# Altium schematic symbol library MCU_ST_STM32F4.SchLib: 300 symbols (part 7 of 10) (continued)
## STM32F446Z_C-E_Tx (continued)
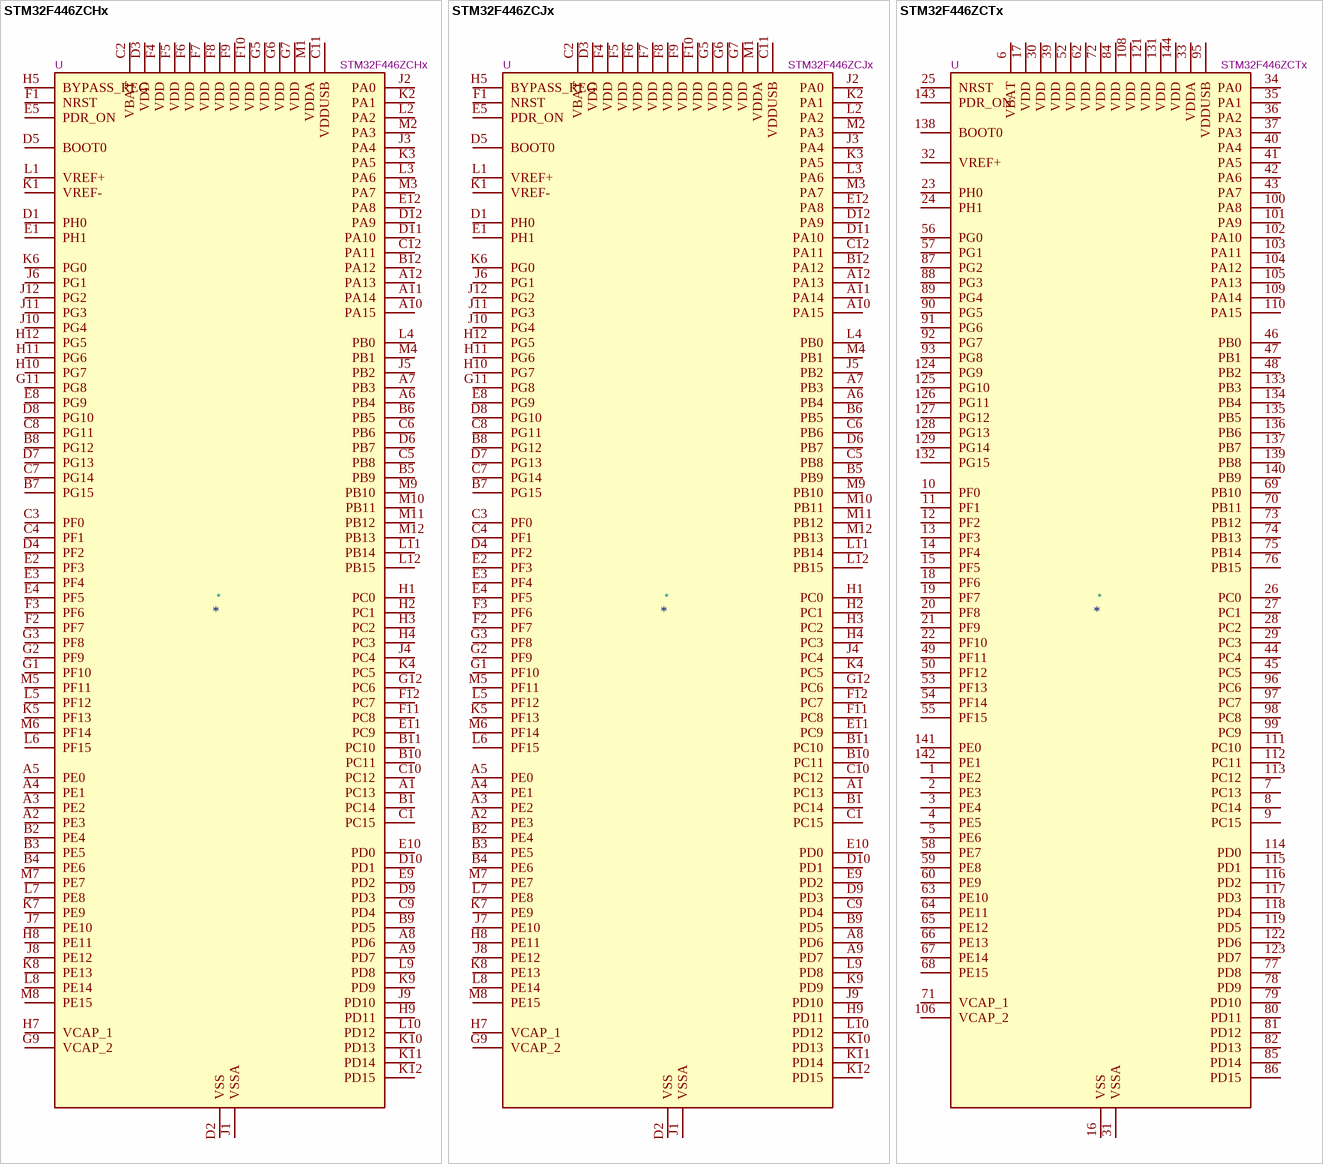
[diagram p56: symbols STM32F446ZCHx to STM32F446ZCTx]

## STM32F446ZCHx
designator *  value STM32F446ZCHx  Reference: U
ki_keywords: Arm Cortex-M4 STM32F4 STM32F446; ki_description: STMicroelectronics Arm Cortex-M4 MCU, 256KB flash, 128KB RAM, 180 MHz, 1.8-3.6V, 114 GPIO, UFBGA144; ki_fp_filters: *UFBGA*7x7mm*Layout12x12*P0.5mm*; Footprint: Package_BGA:UFBGA-144_7x7mm_Layout12x12_P0.5mm; Datasheet: https://www.st.com/resource/en/datasheet/stm32f446zc.pdf
pins: A1 PC13, A2 PE3, A3 PE2, A4 PE1, A5 PE0, A6 PB4, A7 PB3, A8 PD6, A9 PD7, A10 PA15, A11 PA14, A12 PA13, B1 PC14, B2 PE4, B3 PE5, B4 PE6, B5 PB9, B6 PB5, B7 PG15, B8 PG12, B9 PD5, B10 PC11, B11 PC10, B12 PA12, C1 PC15, C2 VBAT, C3 PF0, C4 PF1, C5 PB8, C6 PB6, C7 PG14, C8 PG11, C9 PD4, C10 PC12, C11 VDDUSB, C12 PA11, D1 PH0, D2 VSS, D3 VDD, D4 PF2, D5 BOOT0, D6 PB7, D7 PG13, D8 PG10, D9 PD3, D10 PD1, D11 PA10, D12 PA9, E1 PH1, E2 PF3, E3 PF4, E4 PF5, E5 PDR_ON, E6 VSS hidden, E7 VSS hidden, E8 PG9, E9 PD2, E10 PD0, E11 PC9, E12 PA8, F1 NRST, F2 PF7, F3 PF6, F4 VDD, F5 VDD, F6 VDD, F7 VDD, F8 VDD, F9 VDD, F10 VDD, F11 PC8, F12 PC7, G1 PF10, G2 PF9, G3 PF8, G4 VSS hidden, G5 VDD, G6 VDD, G7 VDD, G8 VSS hidden, G9 VCAP_2, G10 VSS hidden, G11 PG8, G12 PC6, H1 PC0, H2 PC1, H3 PC2, H4 PC3, H5 BYPASS_REG, H6 VSS hidden, H7 VCAP_1, H8 PE11, H9 PD11, H10 PG7, H11 PG6, H12 PG5, J1 VSSA, J2 PA0, J3 PA4, J4 PC4, J5 PB2, J6 PG1, J7 PE10, J8 PE12, J9 PD10, J10 PG4, J11 PG3, J12 PG2, K1 VREF-, K2 PA1, K3 PA5, K4 PC5, K5 PF13, K6 PG0, K7 PE9, K8 PE13, K9 PD9, K10 PD13, K11 PD14, K12 PD15, L1 VREF+, L2 PA2, L3 PA6, L4 PB0, L5 PF12, L6 PF15, L7 PE8, L8 PE14, L9 PD8, L10 PD12, L11 PB14, L12 PB15, M1 VDDA, M2 PA3, M3 PA7, M4 PB1, M5 PF11, M6 PF14, M7 PE7, M8 PE15, M9 PB10, M10 PB11, M11 PB12, M12 PB13

## STM32F446ZCJx
designator *  value STM32F446ZCJx  Reference: U
ki_keywords: Arm Cortex-M4 STM32F4 STM32F446; ki_description: STMicroelectronics Arm Cortex-M4 MCU, 256KB flash, 128KB RAM, 180 MHz, 1.8-3.6V, 114 GPIO, UFBGA144; ki_fp_filters: *UFBGA*10x10mm*Layout12x12*P0.8mm*; Footprint: Package_BGA:UFBGA-144_10x10mm_Layout12x12_P0.8mm; Datasheet: https://www.st.com/resource/en/datasheet/stm32f446zc.pdf
pins: A1 PC13, A2 PE3, A3 PE2, A4 PE1, A5 PE0, A6 PB4, A7 PB3, A8 PD6, A9 PD7, A10 PA15, A11 PA14, A12 PA13, B1 PC14, B2 PE4, B3 PE5, B4 PE6, B5 PB9, B6 PB5, B7 PG15, B8 PG12, B9 PD5, B10 PC11, B11 PC10, B12 PA12, C1 PC15, C2 VBAT, C3 PF0, C4 PF1, C5 PB8, C6 PB6, C7 PG14, C8 PG11, C9 PD4, C10 PC12, C11 VDDUSB, C12 PA11, D1 PH0, D2 VSS, D3 VDD, D4 PF2, D5 BOOT0, D6 PB7, D7 PG13, D8 PG10, D9 PD3, D10 PD1, D11 PA10, D12 PA9, E1 PH1, E2 PF3, E3 PF4, E4 PF5, E5 PDR_ON, E6 VSS hidden, E7 VSS hidden, E8 PG9, E9 PD2, E10 PD0, E11 PC9, E12 PA8, F1 NRST, F2 PF7, F3 PF6, F4 VDD, F5 VDD, F6 VDD, F7 VDD, F8 VDD, F9 VDD, F10 VDD, F11 PC8, F12 PC7, G1 PF10, G2 PF9, G3 PF8, G4 VSS hidden, G5 VDD, G6 VDD, G7 VDD, G8 VSS hidden, G9 VCAP_2, G10 VSS hidden, G11 PG8, G12 PC6, H1 PC0, H2 PC1, H3 PC2, H4 PC3, H5 BYPASS_REG, H6 VSS hidden, H7 VCAP_1, H8 PE11, H9 PD11, H10 PG7, H11 PG6, H12 PG5, J1 VSSA, J2 PA0, J3 PA4, J4 PC4, J5 PB2, J6 PG1, J7 PE10, J8 PE12, J9 PD10, J10 PG4, J11 PG3, J12 PG2, K1 VREF-, K2 PA1, K3 PA5, K4 PC5, K5 PF13, K6 PG0, K7 PE9, K8 PE13, K9 PD9, K10 PD13, K11 PD14, K12 PD15, L1 VREF+, L2 PA2, L3 PA6, L4 PB0, L5 PF12, L6 PF15, L7 PE8, L8 PE14, L9 PD8, L10 PD12, L11 PB14, L12 PB15, M1 VDDA, M2 PA3, M3 PA7, M4 PB1, M5 PF11, M6 PF14, M7 PE7, M8 PE15, M9 PB10, M10 PB11, M11 PB12, M12 PB13

## STM32F446ZCTx
designator *  value STM32F446ZCTx  Reference: U
ki_keywords: Arm Cortex-M4 STM32F4 STM32F446; ki_description: STMicroelectronics Arm Cortex-M4 MCU, 256KB flash, 128KB RAM, 180 MHz, 1.8-3.6V, 114 GPIO, LQFP144; ki_fp_filters: LQFP*20x20mm*P0.5mm*; Footprint: Package_QFP:LQFP-144_20x20mm_P0.5mm; Datasheet: https://www.st.com/resource/en/datasheet/stm32f446zc.pdf
pins: 1 PE2, 2 PE3, 3 PE4, 4 PE5, 5 PE6, 6 VBAT, 7 PC13, 8 PC14, 9 PC15, 10 PF0, 11 PF1, 12 PF2, 13 PF3, 14 PF4, 15 PF5, 16 VSS, 17 VDD, 18 PF6, 19 PF7, 20 PF8, 21 PF9, 22 PF10, 23 PH0, 24 PH1, 25 NRST, 26 PC0, 27 PC1, 28 PC2, 29 PC3, 30 VDD, 31 VSSA, 32 VREF+, 33 VDDA, 34 PA0, 35 PA1, 36 PA2, 37 PA3, 38 VSS hidden, 39 VDD, 40 PA4, 41 PA5, 42 PA6, 43 PA7, 44 PC4, 45 PC5, 46 PB0, 47 PB1, 48 PB2, 49 PF11, 50 PF12, 51 VSS hidden, 52 VDD, 53 PF13, 54 PF14, 55 PF15, 56 PG0, 57 PG1, 58 PE7, 59 PE8, 60 PE9, 61 VSS hidden, 62 VDD, 63 PE10, 64 PE11, 65 PE12, 66 PE13, 67 PE14, 68 PE15, 69 PB10, 70 PB11, 71 VCAP_1, 72 VDD, 73 PB12, 74 PB13, 75 PB14, 76 PB15, 77 PD8, 78 PD9, 79 PD10, 80 PD11, 81 PD12, 82 PD13, 83 VSS hidden, 84 VDD, 85 PD14, 86 PD15, 87 PG2, 88 PG3, 89 PG4, 90 PG5, 91 PG6, 92 PG7, 93 PG8, 94 VSS hidden, 95 VDDUSB, 96 PC6, 97 PC7, 98 PC8, 99 PC9, 100 PA8, 101 PA9, 102 PA10, 103 PA11, 104 PA12, 105 PA13, 106 VCAP_2, 107 VSS hidden, 108 VDD, 109 PA14, 110 PA15, 111 PC10, 112 PC11, 113 PC12, 114 PD0, 115 PD1, 116 PD2, 117 PD3, 118 PD4, 119 PD5, 120 VSS hidden, 121 VDD, 122 PD6, 123 PD7, 124 PG9, 125 PG10, 126 PG11, 127 PG12, 128 PG13, 129 PG14, 130 VSS hidden, 131 VDD, 132 PG15, 133 PB3, 134 PB4, 135 PB5, 136 PB6, 137 PB7, 138 BOOT0, 139 PB8, 140 PB9, 141 PE0, 142 PE1, 143 PDR_ON, 144 VDD

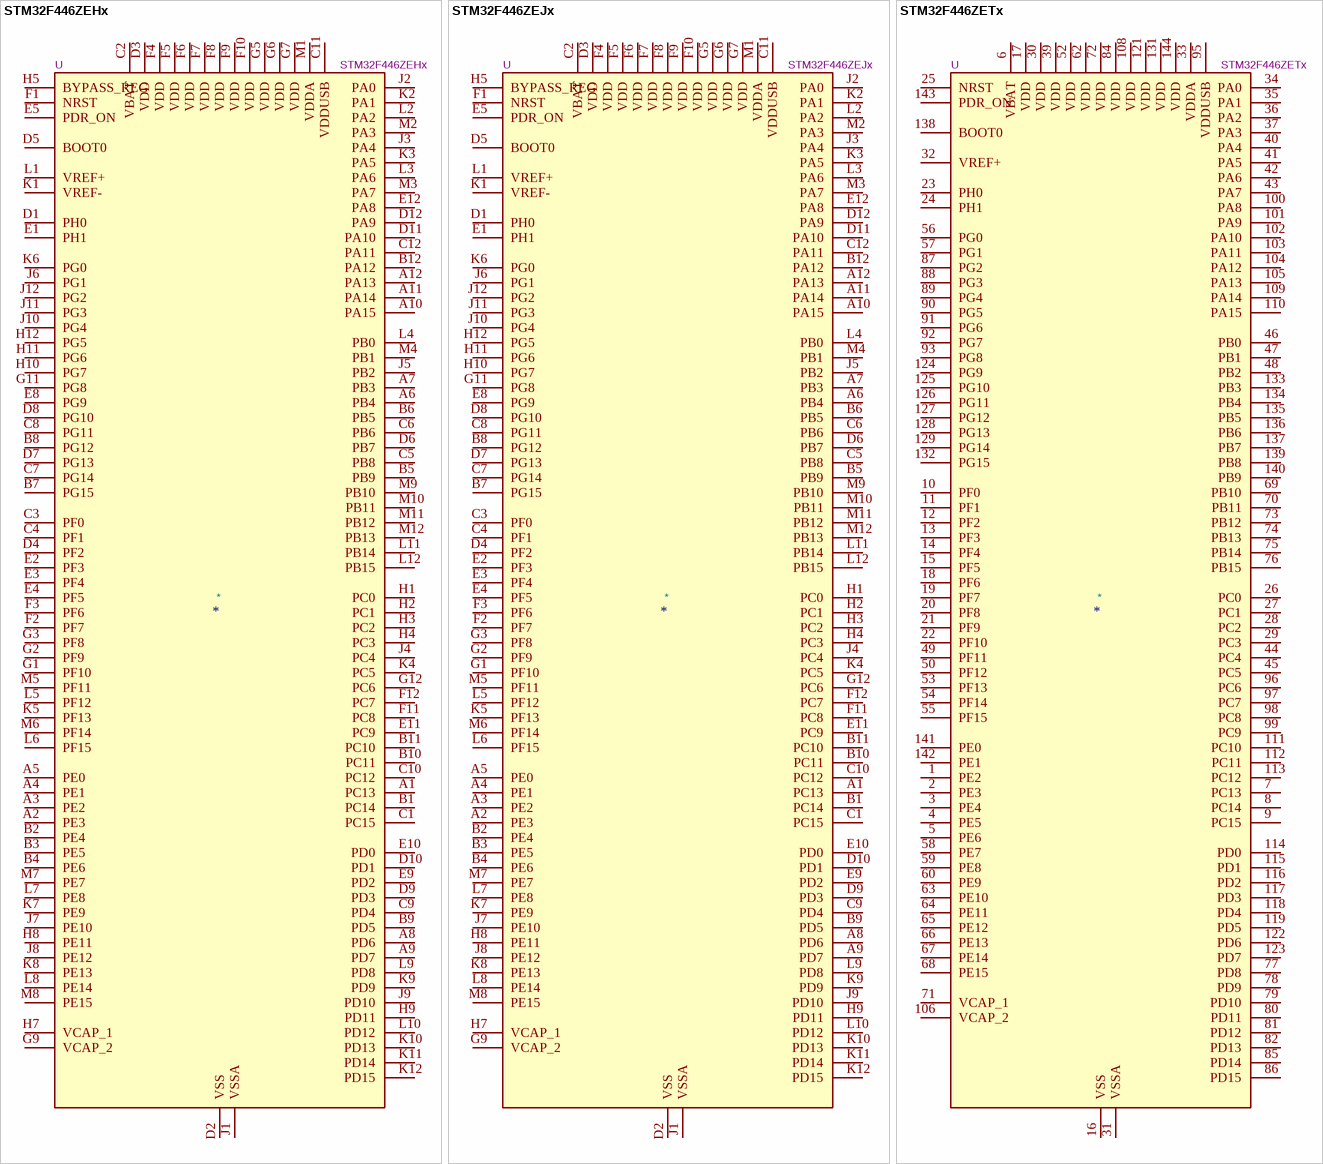
[diagram p57: symbols STM32F446ZEHx to STM32F446ZETx]

## STM32F446ZEHx
designator *  value STM32F446ZEHx  Reference: U
ki_keywords: Arm Cortex-M4 STM32F4 STM32F446; ki_description: STMicroelectronics Arm Cortex-M4 MCU, 512KB flash, 128KB RAM, 180 MHz, 1.8-3.6V, 114 GPIO, UFBGA144; ki_fp_filters: *UFBGA*7x7mm*Layout12x12*P0.5mm*; Footprint: Package_BGA:UFBGA-144_7x7mm_Layout12x12_P0.5mm; Datasheet: https://www.st.com/resource/en/datasheet/stm32f446ze.pdf
pins: A1 PC13, A2 PE3, A3 PE2, A4 PE1, A5 PE0, A6 PB4, A7 PB3, A8 PD6, A9 PD7, A10 PA15, A11 PA14, A12 PA13, B1 PC14, B2 PE4, B3 PE5, B4 PE6, B5 PB9, B6 PB5, B7 PG15, B8 PG12, B9 PD5, B10 PC11, B11 PC10, B12 PA12, C1 PC15, C2 VBAT, C3 PF0, C4 PF1, C5 PB8, C6 PB6, C7 PG14, C8 PG11, C9 PD4, C10 PC12, C11 VDDUSB, C12 PA11, D1 PH0, D2 VSS, D3 VDD, D4 PF2, D5 BOOT0, D6 PB7, D7 PG13, D8 PG10, D9 PD3, D10 PD1, D11 PA10, D12 PA9, E1 PH1, E2 PF3, E3 PF4, E4 PF5, E5 PDR_ON, E6 VSS hidden, E7 VSS hidden, E8 PG9, E9 PD2, E10 PD0, E11 PC9, E12 PA8, F1 NRST, F2 PF7, F3 PF6, F4 VDD, F5 VDD, F6 VDD, F7 VDD, F8 VDD, F9 VDD, F10 VDD, F11 PC8, F12 PC7, G1 PF10, G2 PF9, G3 PF8, G4 VSS hidden, G5 VDD, G6 VDD, G7 VDD, G8 VSS hidden, G9 VCAP_2, G10 VSS hidden, G11 PG8, G12 PC6, H1 PC0, H2 PC1, H3 PC2, H4 PC3, H5 BYPASS_REG, H6 VSS hidden, H7 VCAP_1, H8 PE11, H9 PD11, H10 PG7, H11 PG6, H12 PG5, J1 VSSA, J2 PA0, J3 PA4, J4 PC4, J5 PB2, J6 PG1, J7 PE10, J8 PE12, J9 PD10, J10 PG4, J11 PG3, J12 PG2, K1 VREF-, K2 PA1, K3 PA5, K4 PC5, K5 PF13, K6 PG0, K7 PE9, K8 PE13, K9 PD9, K10 PD13, K11 PD14, K12 PD15, L1 VREF+, L2 PA2, L3 PA6, L4 PB0, L5 PF12, L6 PF15, L7 PE8, L8 PE14, L9 PD8, L10 PD12, L11 PB14, L12 PB15, M1 VDDA, M2 PA3, M3 PA7, M4 PB1, M5 PF11, M6 PF14, M7 PE7, M8 PE15, M9 PB10, M10 PB11, M11 PB12, M12 PB13

## STM32F446ZEJx
designator *  value STM32F446ZEJx  Reference: U
ki_keywords: Arm Cortex-M4 STM32F4 STM32F446; ki_description: STMicroelectronics Arm Cortex-M4 MCU, 512KB flash, 128KB RAM, 180 MHz, 1.8-3.6V, 114 GPIO, UFBGA144; ki_fp_filters: *UFBGA*10x10mm*Layout12x12*P0.8mm*; Footprint: Package_BGA:UFBGA-144_10x10mm_Layout12x12_P0.8mm; Datasheet: https://www.st.com/resource/en/datasheet/stm32f446ze.pdf
pins: A1 PC13, A2 PE3, A3 PE2, A4 PE1, A5 PE0, A6 PB4, A7 PB3, A8 PD6, A9 PD7, A10 PA15, A11 PA14, A12 PA13, B1 PC14, B2 PE4, B3 PE5, B4 PE6, B5 PB9, B6 PB5, B7 PG15, B8 PG12, B9 PD5, B10 PC11, B11 PC10, B12 PA12, C1 PC15, C2 VBAT, C3 PF0, C4 PF1, C5 PB8, C6 PB6, C7 PG14, C8 PG11, C9 PD4, C10 PC12, C11 VDDUSB, C12 PA11, D1 PH0, D2 VSS, D3 VDD, D4 PF2, D5 BOOT0, D6 PB7, D7 PG13, D8 PG10, D9 PD3, D10 PD1, D11 PA10, D12 PA9, E1 PH1, E2 PF3, E3 PF4, E4 PF5, E5 PDR_ON, E6 VSS hidden, E7 VSS hidden, E8 PG9, E9 PD2, E10 PD0, E11 PC9, E12 PA8, F1 NRST, F2 PF7, F3 PF6, F4 VDD, F5 VDD, F6 VDD, F7 VDD, F8 VDD, F9 VDD, F10 VDD, F11 PC8, F12 PC7, G1 PF10, G2 PF9, G3 PF8, G4 VSS hidden, G5 VDD, G6 VDD, G7 VDD, G8 VSS hidden, G9 VCAP_2, G10 VSS hidden, G11 PG8, G12 PC6, H1 PC0, H2 PC1, H3 PC2, H4 PC3, H5 BYPASS_REG, H6 VSS hidden, H7 VCAP_1, H8 PE11, H9 PD11, H10 PG7, H11 PG6, H12 PG5, J1 VSSA, J2 PA0, J3 PA4, J4 PC4, J5 PB2, J6 PG1, J7 PE10, J8 PE12, J9 PD10, J10 PG4, J11 PG3, J12 PG2, K1 VREF-, K2 PA1, K3 PA5, K4 PC5, K5 PF13, K6 PG0, K7 PE9, K8 PE13, K9 PD9, K10 PD13, K11 PD14, K12 PD15, L1 VREF+, L2 PA2, L3 PA6, L4 PB0, L5 PF12, L6 PF15, L7 PE8, L8 PE14, L9 PD8, L10 PD12, L11 PB14, L12 PB15, M1 VDDA, M2 PA3, M3 PA7, M4 PB1, M5 PF11, M6 PF14, M7 PE7, M8 PE15, M9 PB10, M10 PB11, M11 PB12, M12 PB13

## STM32F446ZETx
designator *  value STM32F446ZETx  Reference: U
ki_keywords: Arm Cortex-M4 STM32F4 STM32F446; ki_description: STMicroelectronics Arm Cortex-M4 MCU, 512KB flash, 128KB RAM, 180 MHz, 1.8-3.6V, 114 GPIO, LQFP144; ki_fp_filters: LQFP*20x20mm*P0.5mm*; Footprint: Package_QFP:LQFP-144_20x20mm_P0.5mm; Datasheet: https://www.st.com/resource/en/datasheet/stm32f446ze.pdf
pins: 1 PE2, 2 PE3, 3 PE4, 4 PE5, 5 PE6, 6 VBAT, 7 PC13, 8 PC14, 9 PC15, 10 PF0, 11 PF1, 12 PF2, 13 PF3, 14 PF4, 15 PF5, 16 VSS, 17 VDD, 18 PF6, 19 PF7, 20 PF8, 21 PF9, 22 PF10, 23 PH0, 24 PH1, 25 NRST, 26 PC0, 27 PC1, 28 PC2, 29 PC3, 30 VDD, 31 VSSA, 32 VREF+, 33 VDDA, 34 PA0, 35 PA1, 36 PA2, 37 PA3, 38 VSS hidden, 39 VDD, 40 PA4, 41 PA5, 42 PA6, 43 PA7, 44 PC4, 45 PC5, 46 PB0, 47 PB1, 48 PB2, 49 PF11, 50 PF12, 51 VSS hidden, 52 VDD, 53 PF13, 54 PF14, 55 PF15, 56 PG0, 57 PG1, 58 PE7, 59 PE8, 60 PE9, 61 VSS hidden, 62 VDD, 63 PE10, 64 PE11, 65 PE12, 66 PE13, 67 PE14, 68 PE15, 69 PB10, 70 PB11, 71 VCAP_1, 72 VDD, 73 PB12, 74 PB13, 75 PB14, 76 PB15, 77 PD8, 78 PD9, 79 PD10, 80 PD11, 81 PD12, 82 PD13, 83 VSS hidden, 84 VDD, 85 PD14, 86 PD15, 87 PG2, 88 PG3, 89 PG4, 90 PG5, 91 PG6, 92 PG7, 93 PG8, 94 VSS hidden, 95 VDDUSB, 96 PC6, 97 PC7, 98 PC8, 99 PC9, 100 PA8, 101 PA9, 102 PA10, 103 PA11, 104 PA12, 105 PA13, 106 VCAP_2, 107 VSS hidden, 108 VDD, 109 PA14, 110 PA15, 111 PC10, 112 PC11, 113 PC12, 114 PD0, 115 PD1, 116 PD2, 117 PD3, 118 PD4, 119 PD5, 120 VSS hidden, 121 VDD, 122 PD6, 123 PD7, 124 PG9, 125 PG10, 126 PG11, 127 PG12, 128 PG13, 129 PG14, 130 VSS hidden, 131 VDD, 132 PG15, 133 PB3, 134 PB4, 135 PB5, 136 PB6, 137 PB7, 138 BOOT0, 139 PB8, 140 PB9, 141 PE0, 142 PE1, 143 PDR_ON, 144 VDD

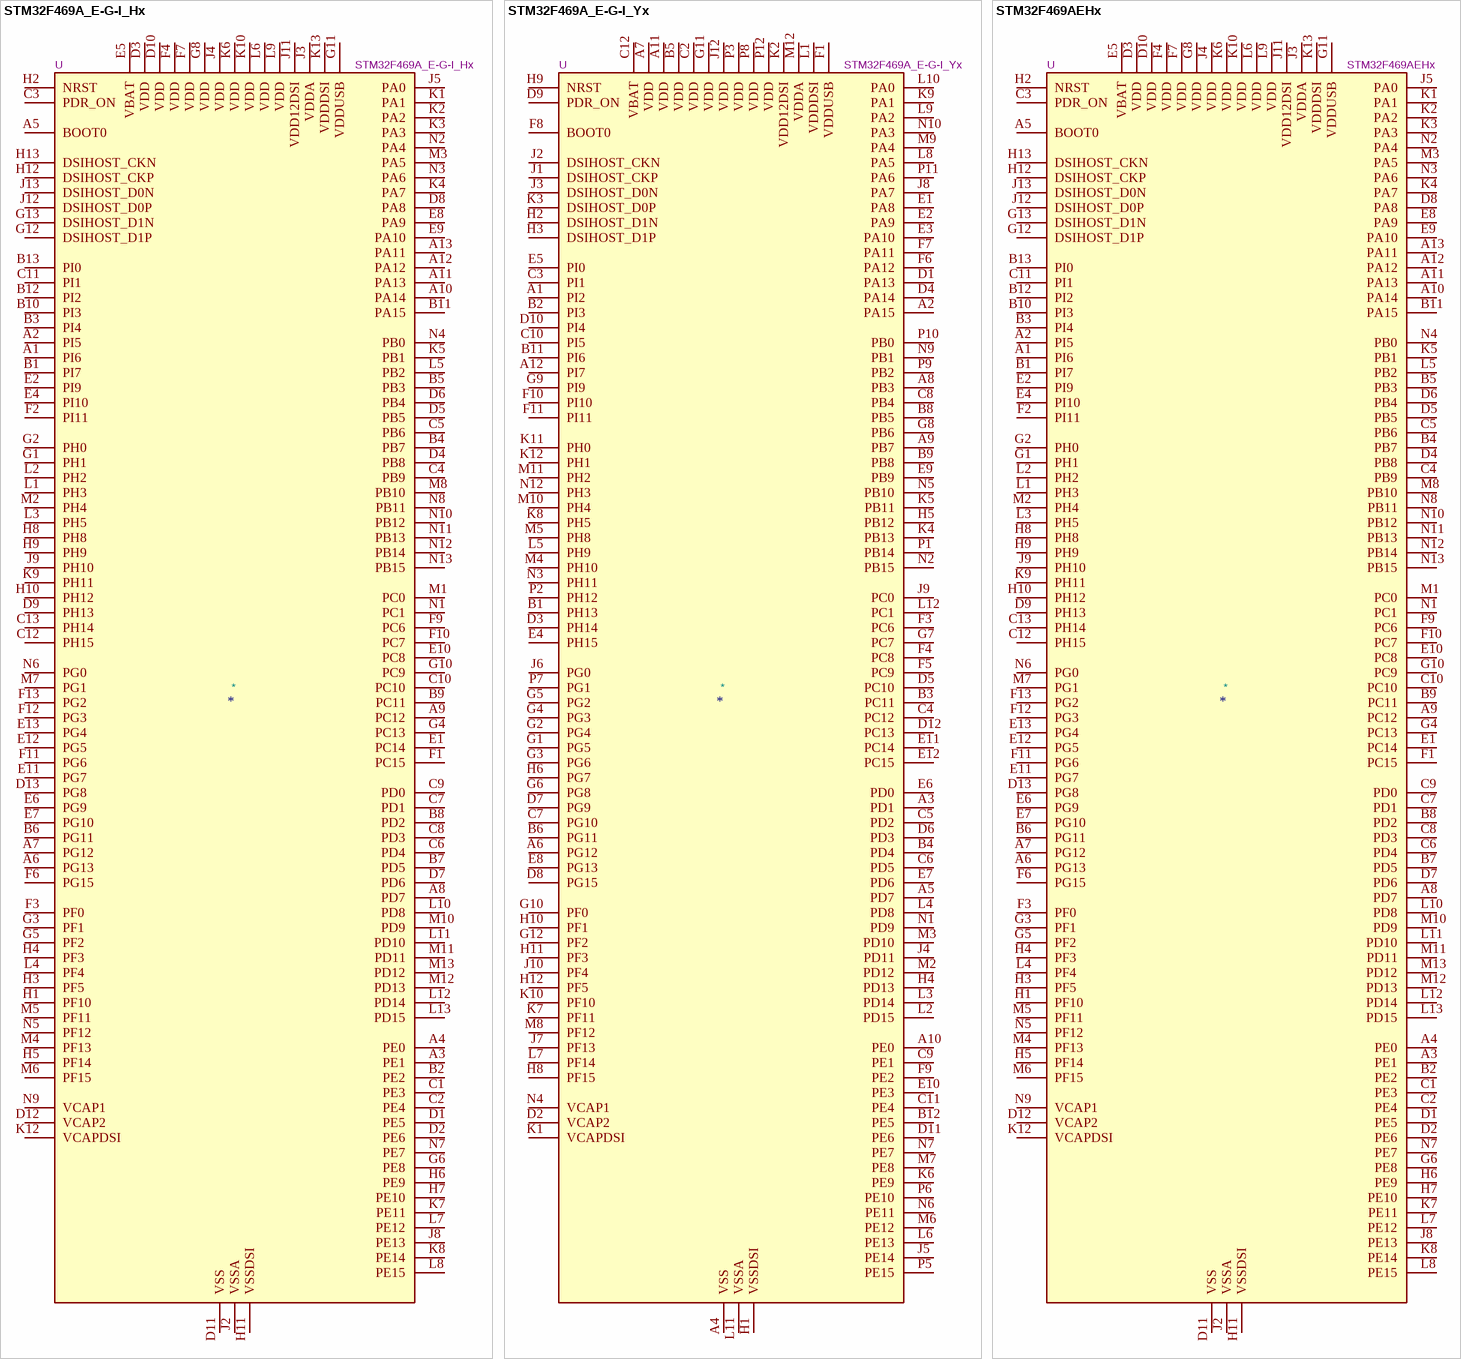
[diagram p58: symbols STM32F469A_E-G-I_Hx to STM32F469AEHx]

## STM32F469A_E-G-I_Hx
designator *  value STM32F469A_E-G-I_Hx  Reference: U
ki_keywords: Arm Cortex-M4 STM32F4 STM32F469/479; ki_description: STMicroelectronics Arm Cortex-M4 MCU, 512-2048KB flash, 384KB RAM, 180 MHz, 1.7-3.6V, 128 GPIO, UFBGA169; ki_fp_filters: *UFBGA*7x7mm*Layout13x13*P0.5mm*; Footprint: Package_BGA:UFBGA-169_7x7mm_Layout13x13_P0.5mm; Datasheet: https://www.st.com/resource/en/datasheet/stm32f469ae.pdf
pins: A1 PI6, A2 PI5, A3 PE1, A4 PE0, A5 BOOT0, A6 PG13, A7 PG12, A8 PD7, A9 PC12, A10 PA14, A11 PA13, A12 PA12, A13 PA11, B1 PI7, B2 PE2, B3 PI4, B4 PB7, B5 PB3, B6 PG11, B7 PD5, B8 PD2, B9 PC11, B10 PI3, B11 PA15, B12 PI2, B13 PI0, C1 PE3, C2 PE4, C3 PDR_ON, C4 PB9, C5 PB6, C6 PD4, C7 PD1, C8 PD3, C9 PD0, C10 PC10, C11 PI1, C12 PH15, C13 PH14, D1 PE5, D2 PE6, D3 VDD, D4 PB8, D5 PB5, D6 PB4, D7 PD6, D8 PA8, D9 PH13, D10 VDD, D11 VSS, D12 VCAP2, D13 PG8, E1 PC14, E2 PI9, E3 VSS hidden, E4 PI10, E5 VBAT, E6 PG9, E7 PG10, E8 PA9, E9 PA10, E10 PC8, E11 PG7, E12 PG5, E13 PG4, F1 PC15, F2 PI11, F3 PF0, F4 VDD, F5 VSS hidden, F6 PG15, F7 VDD, F8 VSS hidden, F9 PC6, F10 PC7, F11 PG6, F12 PG3, F13 PG2, G1 PH1, G2 PH0, G3 PF1, G4 PC13, G5 PF2, G6 PE8, G7 VSS hidden, G8 VDD, G9 VSS hidden, G10 PC9, G11 VDDUSB, G12 DSIHOST_D1P, G13 DSIHOST_D1N, H1 PF10, H2 NRST, H3 PF5, H4 PF3, H5 PF14, H6 PE9, H7 PE10, H8 PH8, H9 PH9, H10 PH12, H11 VSSDSI, H12 DSIHOST_CKP, H13 DSIHOST_CKN, J1 VSS hidden, J2 VSSA, J3 VDDA, J4 VDD, J5 PA0, J6 VSS hidden, J7 VSS hidden, J8 PE13, J9 PH10, J10 VSS hidden, J11 VDD12DSI, J12 DSIHOST_D0P, J13 DSIHOST_D0N, K1 PA1, K2 PA2, K3 PA3, K4 PA7, K5 PB1, K6 VDD, K7 PE11, K8 PE14, K9 PH11, K10 VDD, K11 VSSDSI hidden, K12 VCAPDSI, K13 VDDDSI, L1 PH3, L2 PH2, L3 PH5, L4 PF4, L5 PB2, L6 VDD, L7 PE12, L8 PE15, L9 VDD, L10 PD8, L11 PD10, L12 PD14, L13 PD15, M1 PC0, M2 PH4, M3 PA5, M4 PF13, M5 PF11, M6 PF15, M7 PG1, M8 PB10, M9 VSS hidden, M10 PD9, M11 PD11, M12 PD13, M13 PD12, N1 PC1, N2 PA4, N3 PA6, N4 PB0, N5 PF12, N6 PG0, N7 PE7, N8 PB11, N9 VCAP1, N10 PB12, N11 PB13, N12 PB14, N13 PB15

## STM32F469A_E-G-I_Yx
designator *  value STM32F469A_E-G-I_Yx  Reference: U
ki_keywords: Arm Cortex-M4 STM32F4 STM32F469/479; ki_description: STMicroelectronics Arm Cortex-M4 MCU, 512-2048KB flash, 384KB RAM, 180 MHz, 1.7-3.6V, 128 GPIO, WLCSP168; ki_fp_filters: ST*WLCSP*Die434*; Footprint: Package_CSP:ST_WLCSP-168_Die434; Datasheet: https://www.st.com/resource/en/datasheet/stm32f469ae.pdf
pins: A1 PI2, A2 PA15, A3 PD1, A4 VSS, A5 PD7, A6 PG12, A7 VDD, A8 PB3, A9 PB7, A10 PE0, A11 VDD, A12 PI7, B1 PH13, B2 PI3, B3 PC11, B4 PD4, B5 VDD, B6 PG11, B7 VSS hidden, B8 PB5, B9 PB8, B10 VSS hidden, B11 PI6, B12 PE5, C1 VSS hidden, C2 VDD, C3 PI1, C4 PC12, C5 PD2, C6 PD5, C7 PG10, C8 PB4, C9 PE1, C10 PI5, C11 PE4, C12 VBAT, D1 PA13, D2 VCAP2, D3 PH14, D4 PA14, D5 PC10, D6 PD3, D7 PG9, D8 PG15, D9 PDR_ON, D10 PI4, D11 PE6, D12 PC13, E1 PA8, E2 PA9, E3 PA10, E4 PH15, E5 PI0, E6 PD0, E7 PD6, E8 PG13, E9 PB9, E10 PE3, E11 PC14, E12 PC15, F1 VDDUSB, F2 VSS hidden, F3 PC6, F4 PC8, F5 PC9, F6 PA12, F7 PA11, F8 BOOT0, F9 PE2, F10 PI10, F11 PI11, F12 VSS hidden, G1 PG5, G2 PG4, G3 PG6, G4 PG3, G5 PG2, G6 PG8, G7 PC7, G8 PB6, G9 PI9, G10 PF0, G11 VDD, G12 PF2, H1 VSSDSI, H2 DSIHOST_D1N, H3 DSIHOST_D1P, H4 PD13, H5 PB12, H6 PG7, H7 VSS hidden, H8 PF15, H9 NRST, H10 PF1, H11 PF3, H12 PF5, J1 DSIHOST_CKP, J2 DSIHOST_CKN, J3 DSIHOST_D0N, J4 PD11, J5 PE14, J6 PG0, J7 PF13, J8 PA7, J9 PC0, J10 PF4, J11 VSS hidden, J12 VDD, K1 VCAPDSI, K2 VDD12DSI, K3 DSIHOST_D0P, K4 PB13, K5 PB11, K6 PE9, K7 PF11, K8 PH5, K9 PA1, K10 PF10, K11 PH0, K12 PH1, L1 VDDDSI, L2 PD15, L3 PD14, L4 PD8, L5 PH9, L6 PE13, L7 PF14, L8 PA5, L9 PA2, L10 PA0, L11 VSSA, L12 PC1, M1 VSS hidden, M2 PD12, M3 PD10, M4 PH10, M5 PH8, M6 PE12, M7 PE8, M8 PF12, M9 PA4, M10 PH4, M11 PH2, M12 VDDA, N1 PD9, N2 PB15, N3 PH11, N4 VCAP1, N5 PB10, N6 PE11, N7 PE7, N8 VSS hidden, N9 PB1, N10 PA3, N11 VSS hidden, N12 PH3, P1 PB14, P2 PH12, P3 VDD, P4 VSS hidden, P5 PE15, P6 PE10, P7 PG1, P8 VDD, P9 PB2, P10 PB0, P11 PA6, P12 VDD

## STM32F469AEHx
designator *  value STM32F469AEHx  Reference: U
ki_keywords: Arm Cortex-M4 STM32F4 STM32F469/479; ki_description: STMicroelectronics Arm Cortex-M4 MCU, 512KB flash, 384KB RAM, 180 MHz, 1.7-3.6V, 128 GPIO, UFBGA169; ki_fp_filters: *UFBGA*7x7mm*Layout13x13*P0.5mm*; Footprint: Package_BGA:UFBGA-169_7x7mm_Layout13x13_P0.5mm; Datasheet: https://www.st.com/resource/en/datasheet/stm32f469ae.pdf
pins: A1 PI6, A2 PI5, A3 PE1, A4 PE0, A5 BOOT0, A6 PG13, A7 PG12, A8 PD7, A9 PC12, A10 PA14, A11 PA13, A12 PA12, A13 PA11, B1 PI7, B2 PE2, B3 PI4, B4 PB7, B5 PB3, B6 PG11, B7 PD5, B8 PD2, B9 PC11, B10 PI3, B11 PA15, B12 PI2, B13 PI0, C1 PE3, C2 PE4, C3 PDR_ON, C4 PB9, C5 PB6, C6 PD4, C7 PD1, C8 PD3, C9 PD0, C10 PC10, C11 PI1, C12 PH15, C13 PH14, D1 PE5, D2 PE6, D3 VDD, D4 PB8, D5 PB5, D6 PB4, D7 PD6, D8 PA8, D9 PH13, D10 VDD, D11 VSS, D12 VCAP2, D13 PG8, E1 PC14, E2 PI9, E3 VSS hidden, E4 PI10, E5 VBAT, E6 PG9, E7 PG10, E8 PA9, E9 PA10, E10 PC8, E11 PG7, E12 PG5, E13 PG4, F1 PC15, F2 PI11, F3 PF0, F4 VDD, F5 VSS hidden, F6 PG15, F7 VDD, F8 VSS hidden, F9 PC6, F10 PC7, F11 PG6, F12 PG3, F13 PG2, G1 PH1, G2 PH0, G3 PF1, G4 PC13, G5 PF2, G6 PE8, G7 VSS hidden, G8 VDD, G9 VSS hidden, G10 PC9, G11 VDDUSB, G12 DSIHOST_D1P, G13 DSIHOST_D1N, H1 PF10, H2 NRST, H3 PF5, H4 PF3, H5 PF14, H6 PE9, H7 PE10, H8 PH8, H9 PH9, H10 PH12, H11 VSSDSI, H12 DSIHOST_CKP, H13 DSIHOST_CKN, J1 VSS hidden, J2 VSSA, J3 VDDA, J4 VDD, J5 PA0, J6 VSS hidden, J7 VSS hidden, J8 PE13, J9 PH10, J10 VSS hidden, J11 VDD12DSI, J12 DSIHOST_D0P, J13 DSIHOST_D0N, K1 PA1, K2 PA2, K3 PA3, K4 PA7, K5 PB1, K6 VDD, K7 PE11, K8 PE14, K9 PH11, K10 VDD, K11 VSSDSI hidden, K12 VCAPDSI, K13 VDDDSI, L1 PH3, L2 PH2, L3 PH5, L4 PF4, L5 PB2, L6 VDD, L7 PE12, L8 PE15, L9 VDD, L10 PD8, L11 PD10, L12 PD14, L13 PD15, M1 PC0, M2 PH4, M3 PA5, M4 PF13, M5 PF11, M6 PF15, M7 PG1, M8 PB10, M9 VSS hidden, M10 PD9, M11 PD11, M12 PD13, M13 PD12, N1 PC1, N2 PA4, N3 PA6, N4 PB0, N5 PF12, N6 PG0, N7 PE7, N8 PB11, N9 VCAP1, N10 PB12, N11 PB13, N12 PB14, N13 PB15

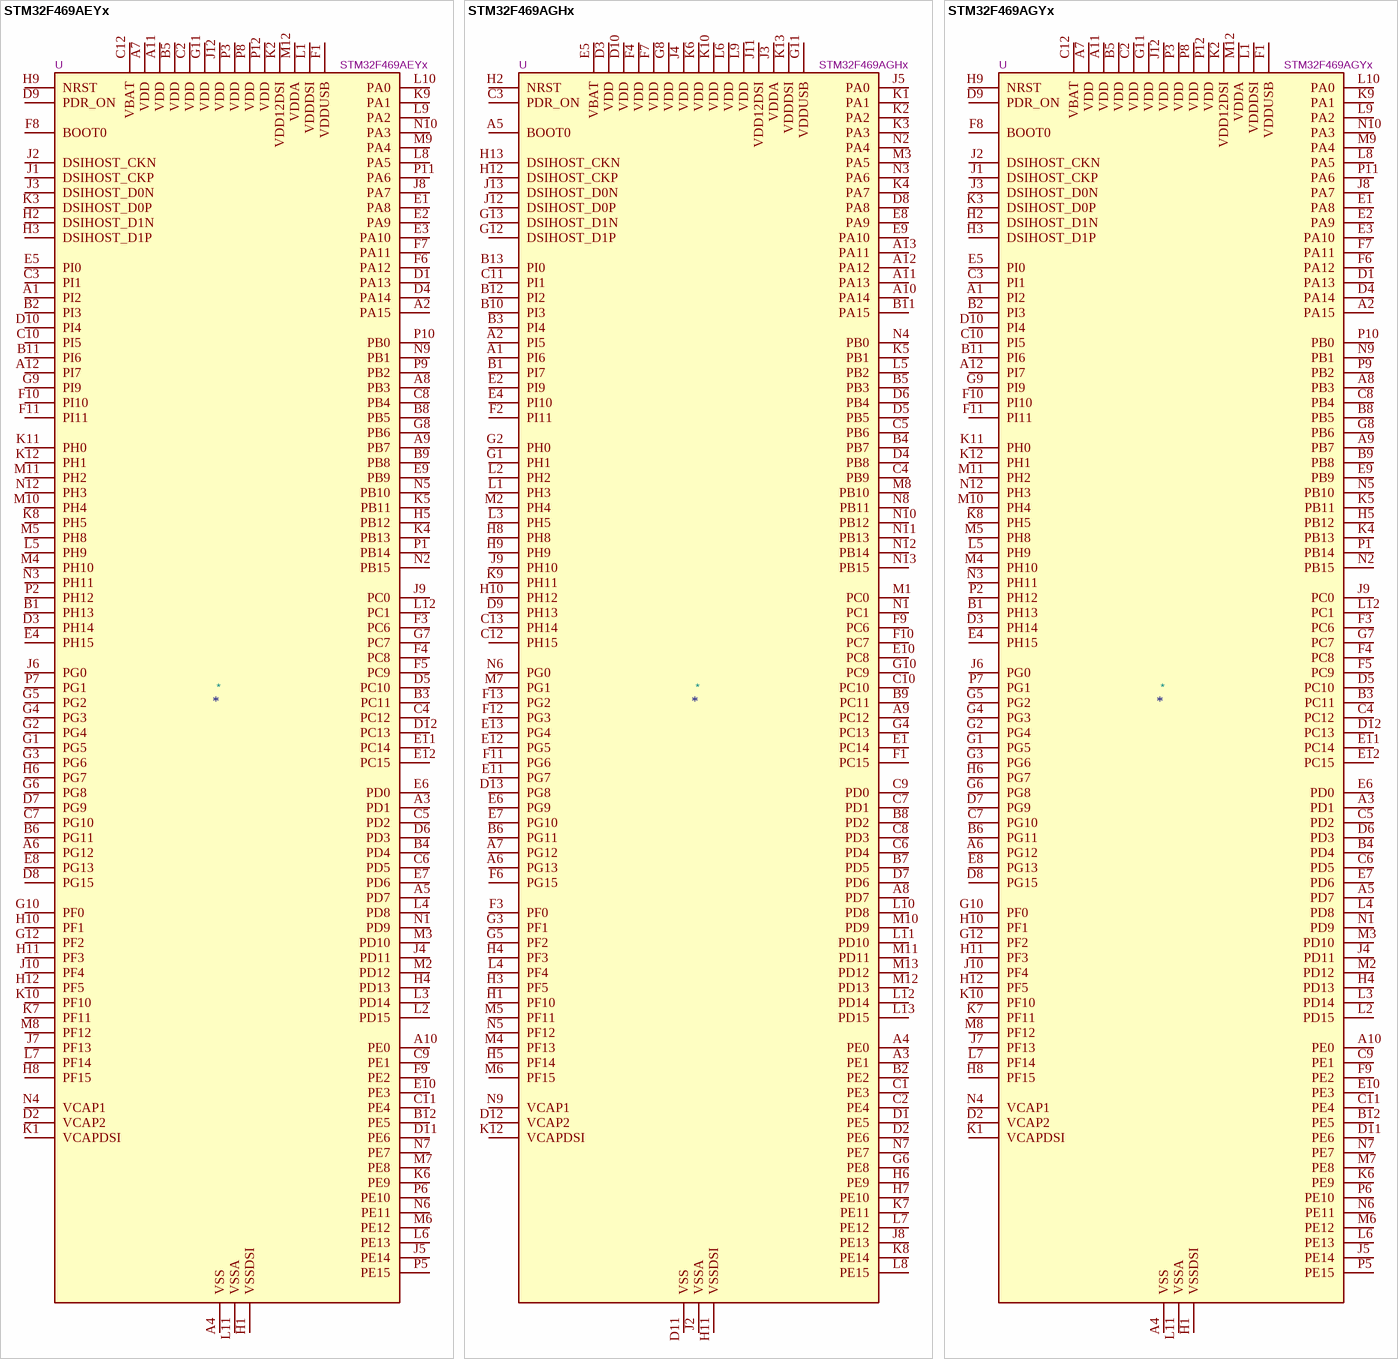
[diagram p59: symbols STM32F469AEYx to STM32F469AGYx]

## STM32F469AEYx
designator *  value STM32F469AEYx  Reference: U
ki_keywords: Arm Cortex-M4 STM32F4 STM32F469/479; ki_description: STMicroelectronics Arm Cortex-M4 MCU, 512KB flash, 384KB RAM, 180 MHz, 1.7-3.6V, 128 GPIO, WLCSP168; ki_fp_filters: ST*WLCSP*Die434*; Footprint: Package_CSP:ST_WLCSP-168_Die434; Datasheet: https://www.st.com/resource/en/datasheet/stm32f469ae.pdf
pins: A1 PI2, A2 PA15, A3 PD1, A4 VSS, A5 PD7, A6 PG12, A7 VDD, A8 PB3, A9 PB7, A10 PE0, A11 VDD, A12 PI7, B1 PH13, B2 PI3, B3 PC11, B4 PD4, B5 VDD, B6 PG11, B7 VSS hidden, B8 PB5, B9 PB8, B10 VSS hidden, B11 PI6, B12 PE5, C1 VSS hidden, C2 VDD, C3 PI1, C4 PC12, C5 PD2, C6 PD5, C7 PG10, C8 PB4, C9 PE1, C10 PI5, C11 PE4, C12 VBAT, D1 PA13, D2 VCAP2, D3 PH14, D4 PA14, D5 PC10, D6 PD3, D7 PG9, D8 PG15, D9 PDR_ON, D10 PI4, D11 PE6, D12 PC13, E1 PA8, E2 PA9, E3 PA10, E4 PH15, E5 PI0, E6 PD0, E7 PD6, E8 PG13, E9 PB9, E10 PE3, E11 PC14, E12 PC15, F1 VDDUSB, F2 VSS hidden, F3 PC6, F4 PC8, F5 PC9, F6 PA12, F7 PA11, F8 BOOT0, F9 PE2, F10 PI10, F11 PI11, F12 VSS hidden, G1 PG5, G2 PG4, G3 PG6, G4 PG3, G5 PG2, G6 PG8, G7 PC7, G8 PB6, G9 PI9, G10 PF0, G11 VDD, G12 PF2, H1 VSSDSI, H2 DSIHOST_D1N, H3 DSIHOST_D1P, H4 PD13, H5 PB12, H6 PG7, H7 VSS hidden, H8 PF15, H9 NRST, H10 PF1, H11 PF3, H12 PF5, J1 DSIHOST_CKP, J2 DSIHOST_CKN, J3 DSIHOST_D0N, J4 PD11, J5 PE14, J6 PG0, J7 PF13, J8 PA7, J9 PC0, J10 PF4, J11 VSS hidden, J12 VDD, K1 VCAPDSI, K2 VDD12DSI, K3 DSIHOST_D0P, K4 PB13, K5 PB11, K6 PE9, K7 PF11, K8 PH5, K9 PA1, K10 PF10, K11 PH0, K12 PH1, L1 VDDDSI, L2 PD15, L3 PD14, L4 PD8, L5 PH9, L6 PE13, L7 PF14, L8 PA5, L9 PA2, L10 PA0, L11 VSSA, L12 PC1, M1 VSS hidden, M2 PD12, M3 PD10, M4 PH10, M5 PH8, M6 PE12, M7 PE8, M8 PF12, M9 PA4, M10 PH4, M11 PH2, M12 VDDA, N1 PD9, N2 PB15, N3 PH11, N4 VCAP1, N5 PB10, N6 PE11, N7 PE7, N8 VSS hidden, N9 PB1, N10 PA3, N11 VSS hidden, N12 PH3, P1 PB14, P2 PH12, P3 VDD, P4 VSS hidden, P5 PE15, P6 PE10, P7 PG1, P8 VDD, P9 PB2, P10 PB0, P11 PA6, P12 VDD